# Altium footprint library 大创_电机驱动板PCB1.PcbLib: 16 footprints
Each footprint in its own frame and in the unit in brackets; x right, y up, seen from the top. Pads: shape width x height; smd on the part's side, far side on the other; paste and mask are expansions set on the pad; w line width, h text height; cw(c..) or ccw(c..) is an arc to the next point about the centre after c.
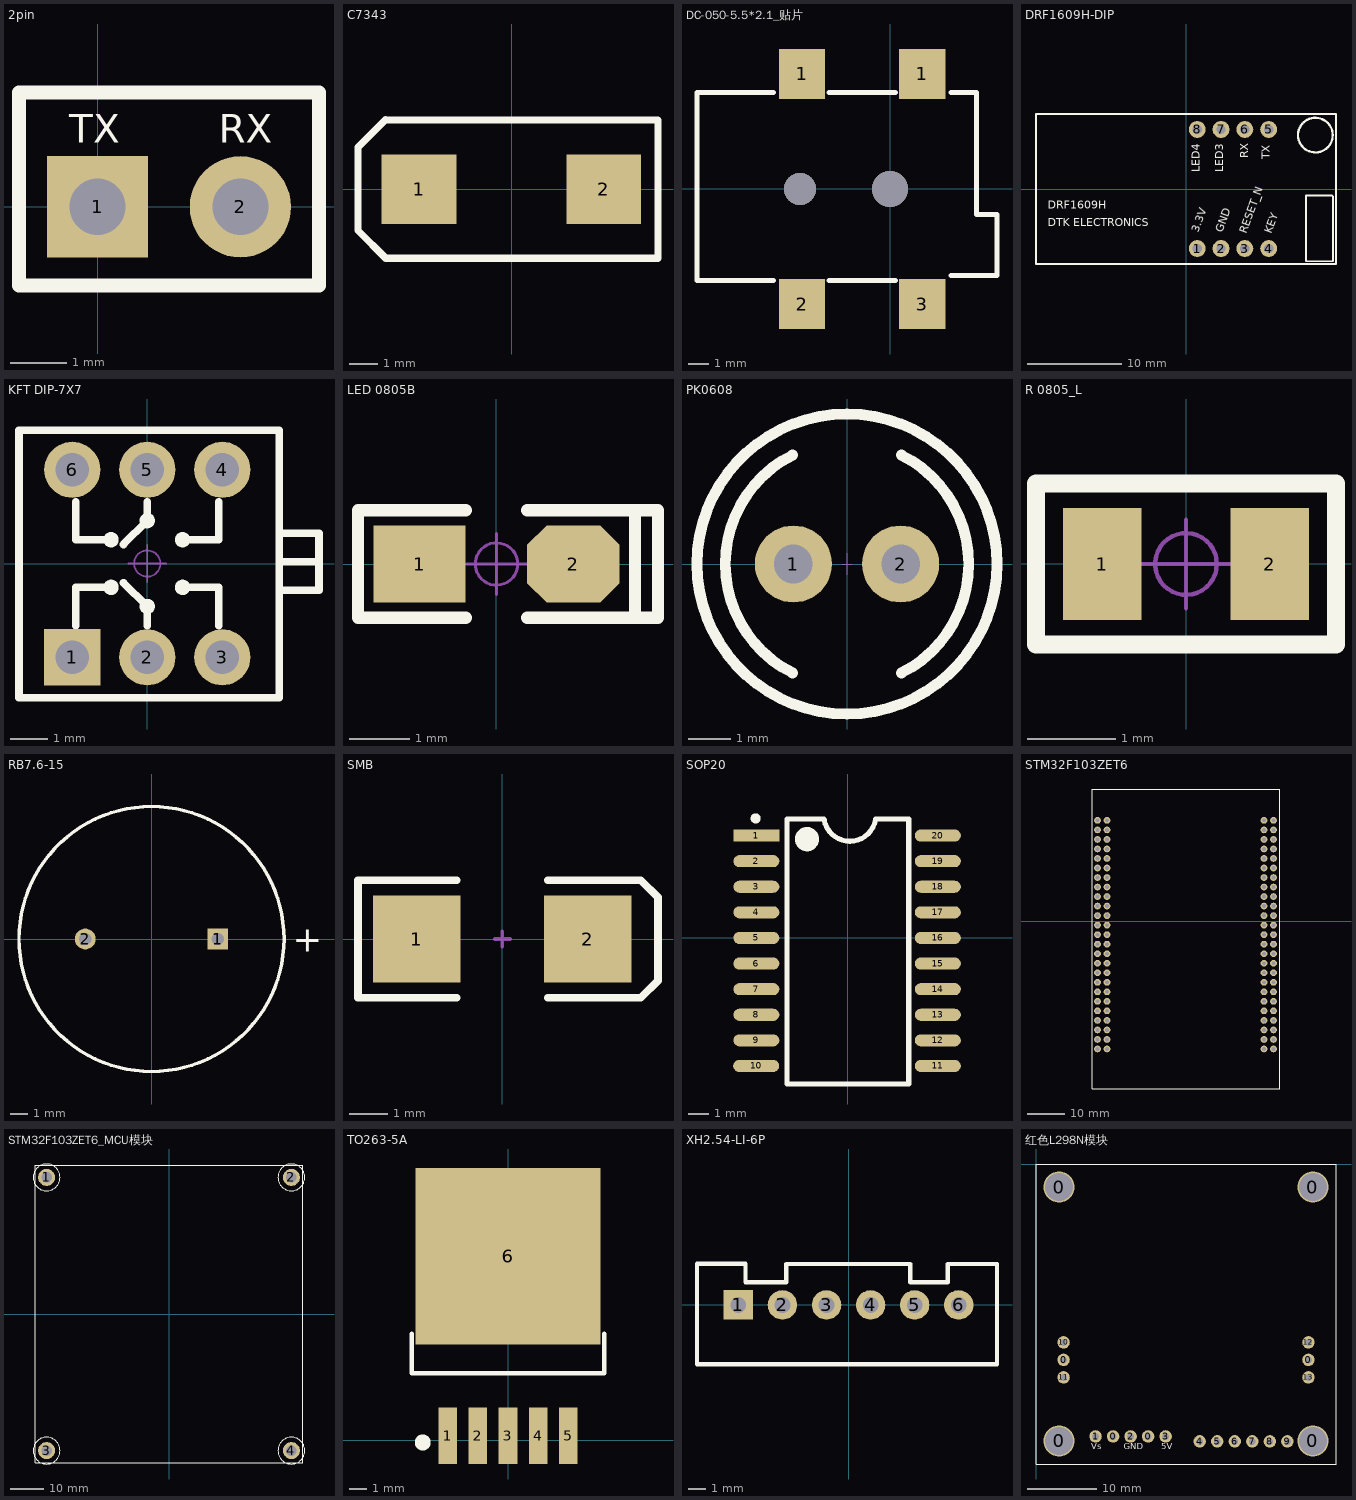
[diagram p0: the footprints below, top view; thin cyan lines are the x and y axes]

## 2pin [mm]
pads (2):
  rect 1.8x1.8 hole 1 paste+0: 1(0,0)
  round 1.8 hole 1 paste+0: 2(2.54,0)
Top Overlay:
  lines w0.254: -1.397,-1.397 3.937,-1.397 3.937,2.032 -1.397,2.032 -1.397,-1.397
  text "RX" at 2.159,1.143 h0.51
  text "TX" at -0.508,1.143 h0.51

## C7343 [mm] "D型  7.3mmx4.3mm（蒜米工坊）"
height 2.8
pads (2):
  rect 2.6x2.4 smd: 1(-3.202,0.007) 2(3.198,0.007)
Top Overlay:
  lines w0.254: -4.369,-2.388 5.08,-2.388 5.08,2.388 ; -4.362,-2.388 -5.325,-1.425 -5.325,1.457 -4.369,2.413 5.08,2.406
3D body "TAJ-D.STEP": height 2.9, standoff 0, extent -3.65,-2.125 3.65,2.175
3D body: height 0.3, standoff 0, extent 3.308,-0.855 3.512,0.915
3D body: height 0.3, standoff 0, extent -3.487,-0.869 -3.392,0.82

## DC-050-5.5*2.1_贴片 [mm] "5.5*2.1"
pads (4):
  rect 2.3x2.5 smd: 1(-4.4,5.75) 1(1.6,5.75) 2(-4.4,-5.75) 3(1.6,-5.75)
via 0,0 diameter 1.8 hole 1.8
via -4.5,0 diameter 1.6 hole 1.6
Top Overlay:
  lines w0.254: -5.842,-4.572 -9.652,-4.572 -9.652,4.826 -5.842,4.826 ; -3.048,-4.572 0.254,-4.572 ; -3.048,4.826 0.254,4.826 ; 3.048,-4.318 5.334,-4.318 5.334,-1.27 4.318,-1.27 4.318,4.826 3.048,4.826
3D body "DC-050.STEP": height 11, standoff -1.4, extent -9.593,-6.3 5.207,6.3

## DRF1609H-DIP [mm]
height 3
pads (8):
  round 1.8 hole 1: 1(1.2,-6.35) 2(3.74,-6.35) 3(6.28,-6.35) 4(8.82,-6.35) 5(8.82,6.35) 6(6.28,6.35) 7(3.74,6.35) 8(1.2,6.35)
Top Overlay:
  circle w0.25: c13.799,5.75 r1.851
  lines w0.2: -0.25,8 -7.65,8 -12.75,8 -16,8 -16,-8 -2.7,-8 0.175,-8 10.325,-8 ; -0.2,8 10.25,8 16,8 16,-8 10.25,-8 ; 12.8,-0.8 12.8,-7.7 15.7,-7.7 15.7,-0.8 ; 12.8,-0.7 15.6,-0.7
  text "LED4" at 1.778,1.778 h1.5
  text "LED3" at 4.318,1.778 h1.5
  text "RX" at 6.985,3.302 h1.5
  text "TX" at 9.271,3.175 h1.5
  text "KEY" at 9.398,-4.953 h1.5
  text "RESET_N" at 6.731,-4.953 h1.5
  text "GND" at 4.191,-4.826 h1.5
  text "3.3V" at 1.651,-4.826 h1.5
  text "DRF1609H" at -14.732,-2.413 h1.5
  text "DTK ELECTRONICS" at -14.732,-4.318 h1.5

## KFT DIP-7X7 [mm] "自锁开关，规格：7*7mm"
pads (6):
  rect 1.5x1.5 hole 0.9: 1(-2,-2.5)
  round 1.5 hole 0.9: 2(0,-2.5) 3(2,-2.5) 4(2,2.5) 5(0,2.5) 6(-2,2.5)
Top Overlay:
  circle w0.254: c0.94,0.635 r0.076
  circle w0.254: c-0.965,0.635 r0.076
  circle w0.254: c0,1.143 r0.076
  circle w0.254: c0,-1.143 r0.076
  circle w0.254: c-0.965,-0.635 r0.076
  circle w0.254: c0.94,-0.635 r0.076
  lines w0.203: -1.905,-1.651 -1.905,-0.635 -0.889,-0.635 ; -1.905,1.651 -1.905,0.635 -0.889,0.635 ; -0.635,-0.508 0,-1.143 0,-1.651 ; -0.635,0.508 0,1.143 0,1.651 ; 1.016,-0.635 1.905,-0.635 1.905,-1.651 ; 1.016,0.635 1.905,0.635 1.905,1.651 ; 3.514,0.05 4.579,0.05 ; 3.563,-0.712 4.579,-0.712 4.579,0.812 3.563,0.812 ; -3.42,-3.581 -3.42,3.556 3.514,3.556 3.514,2.54 3.514,-3.581 -3.42,-3.581
Mechanical 15:
  circle w0.05: c0,0 r0.35
  lines w0.05: -0.5,0 0.5,0 ; 0,-0.5 0,0.5
3D body "SLSW 7x7.STEP": height 11.2, standoff -3.2, extent -3.5,-3.5 3.5,3.5

## LED 0805B [mil] "蓝色0805LED"
pads (2):
  rect 60x50 smd: 1(-50,0)
  oct 60x50 smd: 2(50,0)
Top Overlay:
  lines w8: -20,-35 -90,-35 -90,35 -20,35 ; 20,-35 105,-35 105,35 20,35 ; 90,-35 90,35
Mechanical 15:
  circle w1.97: c0,0 r13.78
  lines w1.97: -19.68,0 19.68,0 ; 0,-19.68 0,19.68
3D body "LED 0805-B.STEP": height 26.33, standoff -0.16, extent -39.37,-24.65 39.37,24.65
3D body "LED 0805玻璃罩.STEP": height 31.69, standoff 12.01, extent -29.49,-24.65 29.49,24.65

## PK0608 [mm] "2.5*7*10mm(脚距，直径，高）"
pads (2):
  round 1.8 hole 0.9: 1(-1.25,0) 2(1.25,0)
Top Overlay:
  circle w0.254: c0,0 r3.5
  lines w0.254: -1.27,-2.54 cw(c0,0) -1.27,2.54 ; 1.27,-2.54 ccw(c0,0) 1.27,2.54
Mechanical 15:
  lines w0.01: -0.127,0 0.127,0 ; 0,-0.254 0,0.254
3D body "PK0608.STEP": height 10.02, standoff -2.78, extent -3.5,-3.5 3.5,3.5

## R 0805_L [mil] "1/8W贴片电阻"
pads (2):
  rect 35x50 smd: 1(-37.4,0) 2(37.4,0)
Top Overlay:
  lines w8: -66.93,-36 -66.93,36 66.93,36 66.93,-36 -66.93,-36
Mechanical 15:
  circle w1.97: c0,0 r13.78
  lines w1.97: -19.68,0 19.68,0 ; 0,-19.68 0,19.68
3D body "R 0805.STEP": height 19.72, standoff -0.24, extent -39.37,-24.6 39.37,24.61

## RB7.6-15 [mm] "Polarized Capacitor (Radial); 2 Leads"
pads (2):
  rect 1.2x1.2 hole 0.7: 1(3.81,0)
  round 1.2 hole 0.7: 2(-3.81,0)
Top Overlay:
  circle w0.2: c0,0 r7.62
  text "+" at 8.132,-0.737 h1.5

## SMB [mm] "DO-214-AA/SMB; 2 C-Bend Leads; Body 5.3 x 3.6 mm, inc. leads (LxW)"
height 2.54
pads (2):
  rect 2.3x2.3 smd: 1(-2.25,0) 2(2.25,0)
Top Overlay:
  lines w0.2: -1.2,-1.55 -3.8,-1.55 -3.8,1.55 -1.2,1.55 ; 1.2,-1.55 3.65,-1.55 4.1,-1.1 4.1,1.1 3.65,1.55 1.2,1.55
Mechanical 1:
  lines w0.1: -0.2,0 0.2,0 ; 0,-0.2 0,0.2

## SOP20 [mm] "（蒜米工坊）"
height 2.36
pads (20):
  rect 2.286x0.6 smd: 1(-4.534,5.08)
  oval 2.286x0.6 smd: 2(-4.534,3.81) 3(-4.534,2.54) 4(-4.534,1.27) 5(-4.534,0) 6(-4.534,-1.27) 7(-4.534,-2.54) 8(-4.534,-3.81) 9(-4.534,-5.08) 10(-4.544,-6.35) 11(4.465,-6.35) 12(4.465,-5.08) 13(4.465,-3.81) 14(4.465,-2.54) 15(4.465,-1.27) 16(4.465,0) 17(4.465,1.27) 18(4.465,2.54) 19(4.465,3.81) 20(4.465,5.08)
Top Overlay:
  circle w0.6: c-2.025,4.9 r0.3
  circle w0.25: c-4.575,5.93 r0.125
  lines w0.254: -1.194,5.9 -3.025,5.9 -3.025,-7.239 3.025,-7.239 3.025,5.9 1.372,5.9 ; -1.17,5.844 ccw(c0.101,6.094) 1.372,5.842
3D body "SO-20_(Wide).STEP": height 2.7, standoff 0, extent -5.15,-7.035 5.15,5.765

## STM32F103ZET6 [mm]
pads (100):
  round 1.8 hole 1 paste+0: 1(77.089,26.924) 2(77.089,24.384) 3(77.089,21.844) 4(77.089,19.304) 5(77.089,16.764) 6(77.089,14.224) 7(77.089,11.684) 8(77.089,9.144) 9(77.089,6.604) 10(77.089,4.064) 11(77.089,1.524) 12(77.089,-1.016) 13(77.089,-3.556) 14(77.089,-6.096) 15(77.089,-8.636) 16(77.089,-11.176) 17(77.089,-13.716) 18(77.089,-16.256) 19(77.089,-18.796) 20(77.089,-21.336) 21(77.089,-23.876) 22(77.089,-26.416) 23(77.089,-28.956) 24(77.089,-31.496) 25(77.089,-34.036) 26(79.629,-34.036) 27(79.629,-31.496) 28(79.629,-28.956) 29(79.629,-26.416) 30(79.629,-23.876) 31(79.629,-21.336) 32(79.629,-18.796) 33(79.629,-16.256) 34(79.629,-13.716) 35(79.629,-11.176) 36(79.629,-8.636) 37(79.629,-6.096) 38(79.629,-3.556) 39(79.629,-1.016) 40(79.629,1.524) 41(79.629,4.064) 42(79.629,6.604) 43(79.629,9.144) 44(79.629,11.684) 45(79.629,14.224) 46(79.629,16.764) 47(79.629,19.304) 48(79.629,21.844) 49(79.629,24.384) 50(79.629,26.924) 51(121.489,26.924) 52(121.489,24.384) 53(121.489,21.844) 54(121.489,19.304) 55(121.489,16.764) 56(121.489,14.224) 57(121.489,11.684) 58(121.489,9.144) 59(121.489,6.604) 60(121.489,4.064) 61(121.489,1.524) 62(121.489,-1.016) 63(121.489,-3.556) 64(121.489,-6.096) 65(121.489,-8.636) 66(121.489,-11.176) 67(121.489,-13.716) 68(121.489,-16.256) 69(121.489,-18.796) 70(121.489,-21.336) 71(121.489,-23.876) 72(121.489,-26.416) 73(121.489,-28.956) 74(121.489,-31.496) 75(121.489,-34.036) 76(124.029,26.924) 77(124.029,24.384) 78(124.029,21.844) 79(124.029,19.304) 80(124.029,16.764) 81(124.029,14.224) 82(124.029,11.684) 83(124.029,9.144) 84(124.029,6.604) 85(124.029,4.064) 86(124.029,1.524) 87(124.029,-1.016) 88(124.029,-3.556) 89(124.029,-6.096) 90(124.029,-8.636) 91(124.029,-11.176) 92(124.029,-13.716) 93(124.029,-16.256) 94(124.029,-18.796) 95(124.029,-21.336) 96(124.029,-23.876) 97(124.029,-26.416) 98(124.029,-28.956) 99(124.029,-31.496) 100(124.029,-34.036)
Top Overlay:
  lines w0.254: 75.692,-44.71 75.692,35.29 125.692,35.29 125.692,-44.71 75.692,-44.71

## STM32F103ZET6_MCU模块 [mil] "M3铜柱，长：10mm"
pads (4):
  round 200 hole 125: 1(-1440,1607.5) 2(1440,1607.5) 3(-1440,-1607.5) 4(1440,-1607.5)
Top Overlay:
  circle w10: c-1440,1607.5 r157.48
  circle w10: c1440,1607.5 r157.48
  circle w10: c-1440,-1607.5 r157.48
  circle w10: c1440,-1607.5 r157.48
  lines w10: -1575,-1752.5 -1575,1752.5 1575,1752.5 1575,-1752.5 -1575,-1752.5
3D body "M3x10.STEP": height 395.67, standoff 1.96, extent -1546.22,1514.98 -1333.78,1700.02
3D body "M3x10.STEP": height 395.67, standoff 1.96, extent 1333.78,1514.98 1546.22,1700.02
3D body "M3x10.STEP": height 395.67, standoff 1.96, extent -1546.22,-1700.02 -1333.78,-1514.98
3D body "M3x10.STEP": height 395.67, standoff 1.96, extent 1333.78,-1700.02 1546.22,-1514.98

## TO263-5A [mm] "263，5脚晶体管"
pads (6):
  rect 1.05x3.2 smd: 1(-3.4,0.254) 2(-1.7,0.254) 3(0,0.254) 4(1.7,0.254) 5(3.4,0.254)
  rect 10.45x10 smd: 6(0,10.414)
Top Overlay:
  circle w0.5: c-4.826,-0.127 r0.2
  lines w0.254: -5.461,6.037 -5.461,3.787 5.461,3.787 5.461,6.037
3D body "TO263-5A.STEP": height 4.5, standoff 0, extent -5,0.244 5,13.571

## XH2.54-LI-6P [mm] "接插件，6P"
pads (6):
  rect 1.7x1.7 hole 0.9: 1(-6.35,0)
  round 1.7 hole 0.9: 2(-3.81,0) 3(-1.27,0) 4(1.27,0) 5(3.81,0) 6(6.35,0)
Top Overlay:
  lines w0.254: -8.738,-3.429 8.56,-3.429 8.56,2.362 5.715,2.362 5.715,1.321 3.556,1.321 3.556,2.362 -3.581,2.362 -3.581,1.321 -5.944,1.321 -5.944,2.388 -8.738,2.388 -8.738,-3.429
3D body "XH2.54-6P.STEP": height 7.03, standoff -2.47, extent -8.85,-3.3 8.85,2.4

## 红色L298N模块 [mm]
pads (21):
  round 4.5 hole 4 unplated paste+0: 0(3.34,-40.16) 0(3.34,-3.34) 0(40.16,-40.16) 0(40.16,-3.34)
  round 1.8 hole 1 paste+0: 0(4,-28.4) 0(11.18,-39.5) 0(16.26,-39.5) 0(39.5,-28.4) 1(8.64,-39.5) 2(13.72,-39.5) 3(18.8,-39.5) 4(23.74,-40.22) 5(26.28,-40.22) 6(28.82,-40.22) 7(31.36,-40.22) 8(33.9,-40.22) 9(36.44,-40.22) 10(4,-25.86) 11(4,-30.94) 12(39.5,-25.86) 13(39.5,-30.94)
Top Overlay:
  circle w0.127: c3.34,-3.34 r2
  circle w0.127: c40.16,-3.34 r2
  circle w0.127: c40.16,-40.16 r2
  circle w0.127: c3.34,-40.16 r2
  lines w0.127: 0,-43.5 0,0 43.5,0 43.5,-43.5 0,-43.5
  text "Vs" at 8.001,-41.674 h1.52
  text "GND" at 12.7,-41.667 h1.52
  text "5V" at 18.161,-41.667 h1.52